# Altium footprint library BRT_Components.PcbLib: 132 footprints (part 7 of 9)
Each footprint in its own frame and in the unit in brackets; x right, y up, seen from the top. Pads: shape width x height; smd on the part's side, far side on the other; paste and mask are expansions set on the pad; w line width, h text height; cw(c..) or ccw(c..) is an arc to the next point about the centre after c.
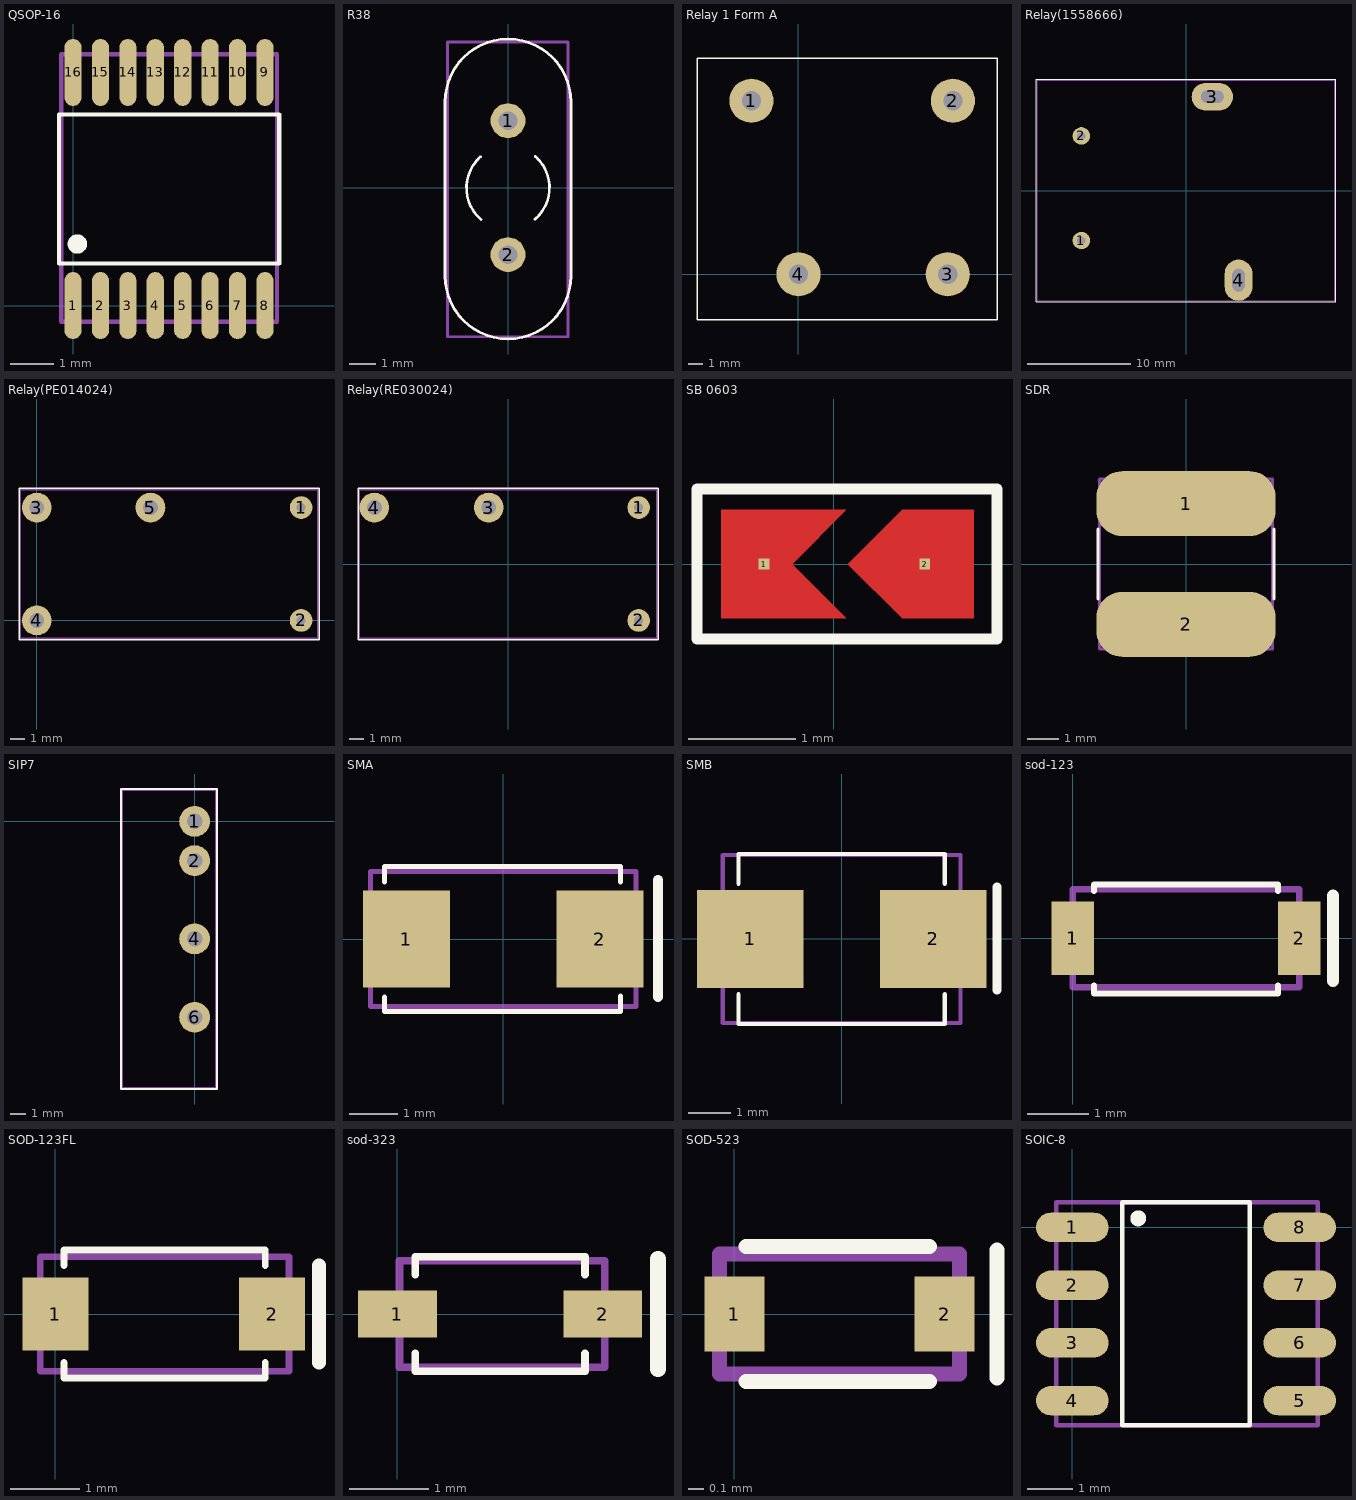
[diagram p6: the footprints below, top view; thin cyan lines are the x and y axes]

## QSOP-16 [mm]
pads (16):
  oval 0.4x1.55 smd paste+0 mask+0.1: 1(0,0) 2(0.635,0) 3(1.27,0) 4(1.905,0) 5(2.54,0) 6(3.175,0) 7(3.81,0) 8(4.445,0) 9(4.445,5.4) 10(3.81,5.4) 11(3.175,5.4) 12(2.54,5.4) 13(1.905,5.4) 14(1.27,5.4) 15(0.635,5.4) 16(0,5.4)
Top Overlay:
  circle w0.25: c0.1,1.425 r0.1
  lines w0.1: -0.325,0.975 4.775,0.975 4.775,4.425 -0.325,4.425 -0.325,0.975
Mechanical 13:
  lines w0.1: -0.275,-0.375 4.725,-0.375 4.725,5.825 -0.275,5.825 -0.275,-0.375
3D body "User Library-QSOP16-1.step": height 1.8, standoff 0.04, extent -0.265,-0.375 4.715,5.825

## R38 [mm] "Crystal"
pads (2):
  round 1.3 hole 0.7: 1(0,2.5) 2(0,-2.5)
Top Overlay:
  lines w0.1: -1.022,1.155 ccw(c0,-0.01) -1.006,-1.189 ; 1.006,-1.179 ccw(c0,0) 1.022,1.165 ; -2.35,-3.3 ccw(c0,-3.3) 2.35,-3.3 2.35,3.2 ccw(c0,3.2) -2.35,3.2 -2.35,-3.3
Mechanical 13:
  lines w0.1: -2.258,-5.561 2.242,-5.561 2.242,5.439 -2.258,5.439 -2.258,-5.561
3D body "Cristal 16MHz.STEP": height 4, standoff -1.5, extent -2.258,-5.561 2.242,5.439

## Relay 1 Form A [mm]
pads (4):
  round 3 hole 1.3: 1(-3.2,11.8) 2(10.5,11.8) 3(10.15,0) 4(0,0)
Top Overlay:
  lines w0.1: -6.9,-3.1 13.5,-3.1 13.5,14.7 -6.9,14.7 -6.9,-3.1
3D body: height 10.8, standoff 0, extent -6.85,-3.1 13.45,14.7

## Relay(1558666) [mm] "TE relay footprint"
pads (4):
  round 1.7 hole 0.8: 1(-10.15,-4.85) 2(-10.15,5.3)
  rrect100% 4x2.7 hole 1.2 slot 2.2 at 0 deg: 3(2.55,9.1)
  rrect100% 2.7x4 hole 2.2 slot 1.2 at 0 deg: 4(5.1,-8.7)
Top Overlay:
  lines w0.1: -14.55,-10.8 14.55,-10.8 14.55,10.8 -14.55,10.8 -14.55,-10.8
Mechanical 13:
  lines w0.1: -14.45,-10.7 14.45,-10.7 14.45,10.7 -14.45,10.7 -14.45,-10.7
3D body "c-1558666-7-b-3d.stp": height 15.7, standoff -3.25, extent -14.45,-10.7 14.45,10.7

## Relay(PE014024) [mm]
pads (5):
  round 1.524 hole 0.6: 1(17.8,7.6) 2(17.8,0)
  round 2 hole 1: 3(0,7.6) 4(0,0) 5(7.65,7.6)
Top Overlay:
  lines w0.1: -1.2,-1.3 19,-1.3 19,8.9 -1.2,8.9 -1.2,-1.3
Mechanical 13:
  lines w0.1: -1.1,-1.2 18.9,-1.2 18.9,8.8 -1.1,8.8 -1.1,-1.2
3D body "PE014024.stp": height 10, standoff -3.8, extent -1.1,-1.2 18.9,8.8

## Relay(RE030024) [mm]
pads (4):
  round 1.524 hole 0.6: 1(8.8,3.8) 2(8.8,-3.8)
  round 2 hole 1: 3(-1.3,3.8) 4(-9,3.8)
Top Overlay:
  lines w0.1: -10.1,-5.1 10.1,-5.1 10.1,5.1 -10.1,5.1 -10.1,-5.1
Mechanical 13:
  lines w0.1: -10,-5 10,-5 10,5 -10,5 -10,-5
3D body "1-1393217-8.stp": height 10.75, standoff -3.45, extent -10,-5 10,5

## SB 0603 [mm] "Jumper"
height 1
pads (2):
  rect 0.1x0.1 smd: 1(-0.65,0) 2(0.85,0)
Top Layer:
  region: 0.641,-0.508 0.134,0 0.642,0.508 1.309,0.508 1.309,-0.508
  region: 0.12,-0.508 -0.388,0 0.12,0.508 -1.05,0.508 -1.05,-0.508
Top Overlay:
  lines w0.1: -1.275,-0.7 1.525,-0.7 1.525,0.7 -1.275,0.7 -1.275,-0.7

## SDR [mm]
pads (2):
  rrect80% 5.8x2.1 smd: 1(0,1.95) 2(0,-1.95)
Top Overlay:
  lines w0.1: -2.85,-1.125 -2.85,1.125 ; 2.85,-1.125 2.85,1.125
Mechanical 13:
  lines w0.1: -2.8,-2.75 2.8,-2.75 2.8,2.75 -2.8,2.75 -2.8,-2.75
3D body "User Library-SDR0604.step": height 4.55, standoff 0, extent -2.8,-2.754 2.8,2.754

## SIP7 [mm]
pads (4):
  round 2 hole 1: 1(0,0) 2(0,-2.54) 4(0,-7.62) 6(0,-12.7)
Top Overlay:
  lines w0.1: -4.775,-17.35 1.45,-17.35 1.45,2.1 -4.775,2.1 -4.775,-17.35
Mechanical 13:
  lines w0.1: -4.7,-17.275 1.375,-17.275 1.375,2.025 -4.7,2.025 -4.7,-17.275
3D body "User Library-SIP-4(7)_A6.step": height 10.16, standoff -2.25, extent -4.7,-17.27 1.39,2.03

## SMA [mm]
pads (2):
  rect 1.8x2 smd: 1(-2,0) 2(2,0)
Top Overlay:
  lines w0.1: -2.45,-1.2 -2.45,-1.5 2.425,-1.5 2.425,-1.175 ; -2.45,1.175 -2.45,1.5 2.425,1.5 2.425,1.175
  lines w0.2: 3.2,-1.2 3.2,1.225
Mechanical 13:
  lines w0.1: -2.743,-1.397 2.743,-1.397 2.743,1.397 -2.743,1.397 -2.743,-1.397
3D body "SMA Diode.step": height 2.29, standoff 0.01, extent -2.743,-1.397 2.743,1.397

## SMB [mm]
pads (2):
  rect 2.5x2.3 smd: 1(-2.15,0) 2(2.15,0)
Top Overlay:
  lines w0.1: -2.425,-1.3 -2.425,-2 2.425,-2 2.425,-1.3 ; -2.425,1.3 -2.425,2 2.425,2 2.425,1.3
  lines w0.2: 3.65,-1.2 3.65,1.225
Mechanical 13:
  lines w0.1: -2.794,-1.975 2.794,-1.975 2.794,1.975 -2.794,1.975 -2.794,-1.975
3D body "User Library-DO-214AA(SMB).step": height 2.65, standoff 0, extent -2.794,-1.975 2.794,1.975

## sod-123 [mm]
pads (2):
  rect 0.7x1.2 smd: 1(0,0) 2(3.7,0)
Top Overlay:
  lines w0.1: 0.35,-0.775 0.35,-0.9 3.35,-0.9 3.35,-0.775 ; 0.35,0.775 0.35,0.875 3.35,0.875 3.35,0.775
  lines w0.2: 4.25,-0.7 4.25,0.7
Mechanical 13:
  lines w0.1: 0,-0.8 0,0.8 3.7,0.8 3.7,-0.8 0,-0.8
3D body "CircuitWorks-SOD123.step": height -0.42, standoff -1.69, extent 0,-0.8 3.7,0.8

## SOD-123FL [mm]
pads (2):
  rect 0.95x1.05 smd: 1(0,0) 2(3.125,0)
Top Overlay:
  lines w0.1: 0.125,-0.7 0.125,-0.925 3.025,-0.925 3.025,-0.7 ; 0.125,0.7 0.125,0.925 3.025,0.925 3.025,0.7
  lines w0.2: 3.8,-0.7 3.8,0.7
Mechanical 13:
  lines w0.1: -0.219,-0.825 3.369,-0.825 3.369,0.825 -0.219,0.825 -0.219,-0.825
3D body "User Library-SOD-123FL.step": height 0.95, standoff 0.01, extent -0.219,-0.825 3.369,0.825

## sod-323 [mm]
pads (2):
  rect 1x0.6 smd: 1(0,0) 2(2.6,0)
Top Overlay:
  lines w0.1: 0.225,-0.5 0.225,-0.725 2.375,-0.725 2.375,-0.5 ; 0.225,0.5 0.225,0.725 2.375,0.725 2.375,0.5
  lines w0.2: 3.3,-0.7 3.3,0.7
Mechanical 13:
  lines w0.1: 0.025,-0.675 0.025,0.675 2.625,0.675 2.625,-0.675 0.025,-0.675
3D body "SOD-323.step": height 1.1, standoff 0, extent 0.025,-0.675 2.625,0.675

## SOD-523 [mm]
pads (2):
  rect 0.4x0.5 smd: 1(0,0) 2(1.4,0)
Top Overlay:
  lines w0.1: 0.075,-0.45 1.3,-0.45 ; 0.075,0.45 1.3,0.45 ; 1.75,-0.425 1.75,0.425
Mechanical 13:
  lines w0.1: -0.1,-0.399 1.5,-0.399 1.5,0.399 -0.1,0.399 -0.1,-0.399
3D body "User Library-SOD-523F.step": height 0.7, standoff 0, extent -0.1,-0.399 1.5,0.399

## SOIC-8 [mm]
pads (8):
  oval 1.6x0.65 smd: 1(0,0) 2(0,-1.27) 3(0,-2.54) 4(0,-3.81) 5(5,-3.81) 6(5,-2.54) 7(5,-1.27) 8(5,0)
Top Overlay:
  circle w0.25: c1.45,0.2 r0.05
  lines w0.1: 1.1,-4.35 3.9,-4.35 3.9,0.55 1.1,0.55 1.1,-4.35
Mechanical 13:
  lines w0.1: -0.35,-4.35 5.4,-4.35 5.4,0.55 -0.35,0.55 -0.35,-4.35
3D body "CircuitWorks-SO-8.step": height 1.45, standoff 0, extent -0.364,-4.352 5.414,0.55